# Altium footprint library pcb2D3D库101.PcbLib: 411 footprints (part 25 of 26)
Each footprint in its own frame and in the unit in brackets; x right, y up, seen from the top. Pads: shape width x height; smd on the part's side, far side on the other; paste and mask are expansions set on the pad; w line width, h text height; cw(c..) or ccw(c..) is an arc to the next point about the centre after c.
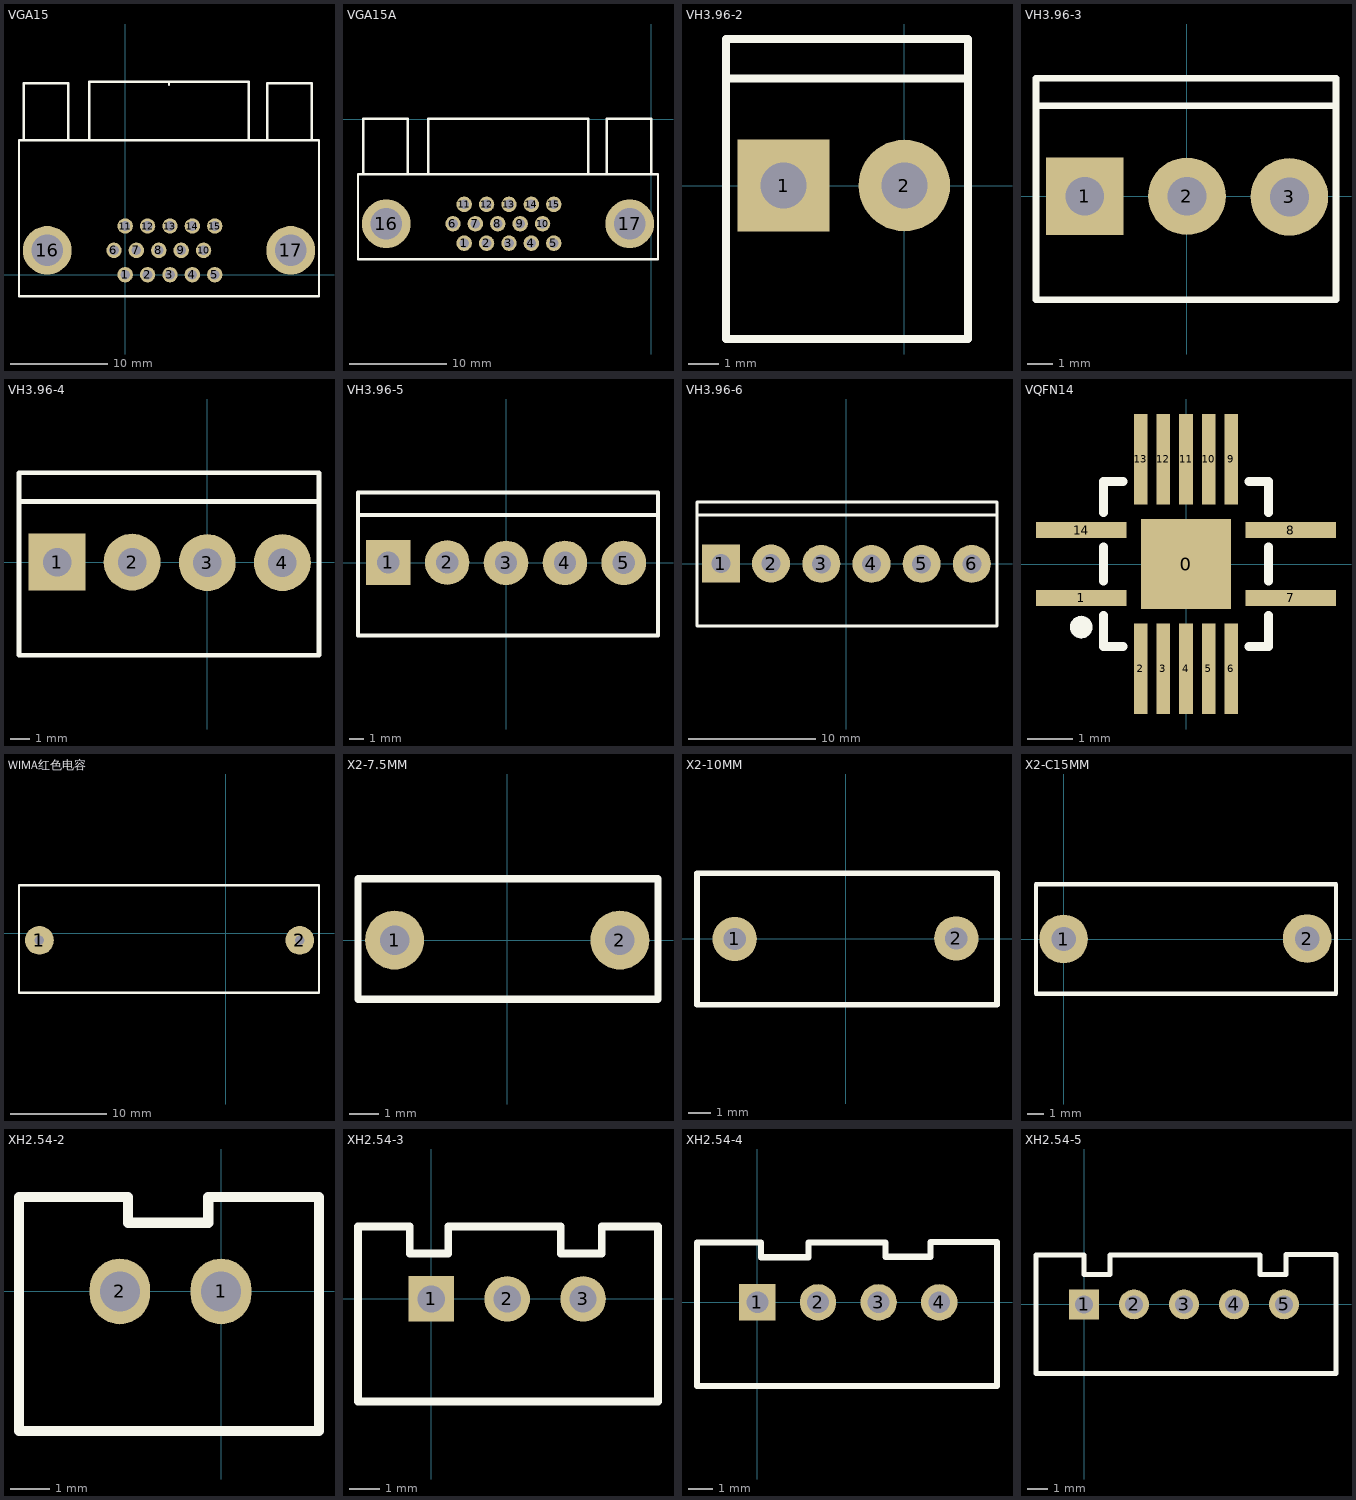
[diagram p24: the footprints below, top view; thin cyan lines are the x and y axes]

## VGA15 [mm]
pads (17):
  round 1.58 hole 1: 1(0,0) 2(2.3,0) 3(4.6,0) 4(6.9,0) 5(9.2,0) 6(-1.15,2.5) 7(1.15,2.5) 8(3.45,2.5) 9(5.75,2.5) 10(8.05,2.5) 11(0,5) 12(2.3,5) 13(4.6,5) 14(6.9,5) 15(9.2,5)
  round 5 hole 3.25: 16(-8,2.5) 17(17,2.5)
TopOverlay:
  lines w0.254: -10.9,-2.2 -10.9,13.8 19.9,13.8 19.9,-2.2 -10.89,-2.2 -10.9,-2.19 ; -10.4,13.8 -10.4,19.67 -5.83,19.67 -5.83,13.82 ; -3.7,13.8 -3.7,19.8 12.7,19.8 12.7,13.8 ; 4.5,19.5 4.5,19.8 ; 14.6,13.8 14.6,19.68 19.18,19.68 19.18,13.84
3D body "SW3dPS-Connector, D-Sub, 15 pin HD, RA, Receptacle.STEP": height 12.77, standoff -3.27, extent -11.055,-0.875 19.755,20.225

## VGA15A [mm]
pads (17):
  round 1.58 hole 1: 1(-19.205,-12.725) 2(-16.905,-12.725) 3(-14.605,-12.725) 4(-12.305,-12.725) 5(-10.005,-12.725) 6(-20.355,-10.733) 7(-18.055,-10.733) 8(-15.755,-10.733) 9(-13.455,-10.733) 10(-11.155,-10.733) 11(-19.205,-8.741) 12(-16.905,-8.741) 13(-14.605,-8.741) 14(-12.305,-8.741) 15(-10.005,-8.741)
  round 5 hole 3.25: 16(-27.205,-10.733) 17(-2.205,-10.733)
TopOverlay:
  lines w0.254: -29.58,-5.664 -29.58,0.025 -25.01,0.025 -25.01,-5.664 ; -22.88,-5.588 -22.88,0.025 -6.48,0.025 -6.48,-5.664 ; -4.58,-5.639 -4.58,0.025 0,0.025 0,-5.639 ; -30.105,-14.354 0.695,-14.354 0.695,-5.664 -30.105,-5.664 -30.105,-14.354
3D body "User Library-SLIM D-SUB RIGHT ANGLE PCB MOUNT.step": height 10.25, standoff -3.09, extent -30.008,-13.801 0.792,-0.331

## VH3.96-2 [mm]
height 3.5
pads (2):
  rect 3x3 hole 1.5 square: 1(-3.96,0)
  round 3 hole 1.5 square: 2(0,0)
TopOverlay:
  lines w0.254: -5.842,3.505 2.057,3.505 ; -5.842,-5.029 2.083,-5.029 2.083,4.801 -5.842,4.801 -5.842,-5.029
3D body "VH2.stp": height 14.83, standoff -3.46, extent -5.816,-5.08 1.956,4.928

## VH3.96-3 [mm]
height 3.5
pads (3):
  rect 3x3 hole 1.5 square: 1(-3.96,0)
  round 3 hole 1.5 square: 2(0,0) 3(3.962,-0.025)
TopOverlay:
  lines w0.254: -5.842,3.505 5.74,3.505 ; -5.842,-4.013 -5.842,4.572 5.766,4.572 5.766,-4.013 -5.842,-4.013
3D body "VH3.stp": height 14.83, standoff -3.46, extent -5.842,-5.15 5.893,4.858

## VH3.96-4 [mm]
height 3.5
pads (4):
  rect 3x3 hole 1.5 square: 1(-7.921,0.013)
  round 3 hole 1.5 square: 2(-3.961,0.013) 3(0.001,-0.013) 4(3.961,-0.013)
TopOverlay:
  lines w0.254: -9.86,3.213 5.893,3.213 ; -9.931,-4.902 -9.931,4.724 5.893,4.724 5.893,-4.902 -9.931,-4.902
3D body "VH4.stp": height 14.83, standoff -3.46, extent -9.83,-5.055 5.867,4.953

## VH3.96-5 [mm]
height 3.5
pads (5):
  rect 3x3 hole 1.5 square: 1(-7.921,0.013)
  round 3 hole 1.5 square: 2(-3.961,0.013) 3(0.001,-0.013) 4(3.961,-0.013) 5(7.921,-0.013)
TopOverlay:
  lines w0.254: -9.86,3.213 10.147,3.213 ; -9.957,-4.902 10.223,-4.902 10.223,4.724 -9.957,4.724 -9.957,-4.902
3D body "VH5.stp": height 14.83, standoff -3.46, extent -9.728,-5.048 9.932,4.959

## VH3.96-6 [mm]
height 3.5
pads (6):
  rect 3x3 hole 1.5 square: 1(-9.901,0.013)
  round 3 hole 1.5 square: 2(-5.941,0.013) 3(-1.979,-0.013) 4(1.981,-0.013) 5(5.941,-0.013) 6(9.901,-0.013)
TopOverlay:
  lines w0.254: -11.789,3.848 11.839,3.848 ; -11.789,-4.928 -11.789,4.877 11.89,4.877 11.89,-4.928 -11.789,-4.928
3D body "VH6.stp": height 14.43, standoff -3.86, extent -11.709,-5.08 11.913,4.928

## VQFN14 [mm]
pads (15):
  rect 2x2 smd: 0(0,0)
  rect 2x0.35 smd: 1(-2.319,-0.75) 7(2.319,-0.75) 8(2.319,0.75) 14(-2.319,0.75)
  rect 0.3x2 smd: 2(-1,-2.316) 3(-0.5,-2.316) 4(0,-2.316) 5(0.5,-2.316) 6(1,-2.316) 9(1,2.316) 10(0.5,2.316) 11(0,2.316) 12(-0.5,2.316) 13(-1,2.316)
TopOverlay:
  circle w0.1: c-2.319,-1.397 r0.2
  region: -2.54,-1.364 -2.319,-1.143 -2.119,-1.343 -2.119,-1.451 -2.319,-1.651 -2.54,-1.43 -2.54,-1.397
  lines w0.2: -1.825,-1.143 -1.825,-1.825 -1.397,-1.825 ; -1.825,-0.381 -1.825,0.381 ; -1.825,1.143 -1.825,1.825 -1.397,1.825 ; 1.397,-1.825 1.825,-1.825 1.825,-1.143 ; 1.397,1.825 1.825,1.825 1.825,1.143 ; 1.825,-0.381 1.825,0.381
3D body: height 0.2, standoff 0, extent 1.825,0.6 1.835,0.9
3D body: height 0.2, standoff 0, extent 1.825,-0.9 1.835,-0.6
3D body: height 0.2, standoff 0, extent -1.835,-0.9 -1.825,-0.6
3D body: height 0.2, standoff 0, extent -1.835,0.6 -1.825,0.9
3D body: height 1.01, standoff 0.01, extent -1.722,-1.442 -1.324,-1.043
3D body: height 1, standoff 0, extent -1.825,-1.825 1.825,1.825
3D body: height 0.2, standoff 0, extent -1.15,1.825 -0.85,1.835
3D body: height 0.2, standoff 0, extent -0.15,1.825 0.15,1.835
3D body: height 0.2, standoff 0, extent 0.35,1.825 0.65,1.835
3D body: height 0.2, standoff 0, extent 0.85,1.825 1.15,1.835
3D body: height 0.2, standoff 0, extent -0.65,1.825 -0.35,1.835
3D body: height 0.2, standoff 0, extent -0.65,-1.835 -0.35,-1.825
3D body: height 0.2, standoff 0, extent -1.15,-1.835 -0.85,-1.825
3D body: height 0.2, standoff 0, extent -0.15,-1.835 0.15,-1.825
3D body: height 0.2, standoff 0, extent 0.35,-1.835 0.65,-1.825
3D body: height 0.2, standoff 0, extent 0.85,-1.835 1.15,-1.825
3D body: height 0, standoff 0, extent -1.175,-1.825 -0.825,-1.316
3D body: height 0, standoff 0, extent -0.675,-1.825 -0.325,-1.316
3D body: height 0, standoff 0, extent -0.175,-1.825 0.175,-1.316
3D body: height 0, standoff 0, extent 0.325,-1.825 0.675,-1.316
3D body: height 0, standoff 0, extent 0.825,-1.825 1.175,-1.316
3D body: height 0, standoff 0, extent -1.175,1.32 -0.825,1.829
3D body: height 0, standoff 0, extent 0.325,1.32 0.675,1.829
3D body: height 0, standoff 0, extent -0.175,1.32 0.175,1.829
3D body: height 0, standoff 0, extent -0.675,1.32 -0.325,1.829
3D body: height 0, standoff 0, extent -1.175,1.32 -0.825,1.829
3D body: height 0, standoff 0, extent 0.825,1.32 1.175,1.829
3D body: height 0, standoff 0, extent 1.32,0.575 1.829,0.925
3D body: height 0, standoff 0, extent 1.32,-0.925 1.829,-0.575
3D body: height 0, standoff 0, extent -1.829,-0.925 -1.32,-0.575
3D body: height 0, standoff 0, extent -1.829,0.575 -1.32,0.925
3D body: height 0, standoff 0, extent -1.025,-1.025 1.025,1.025

## WIMA红色电容 [mm]
pads (2):
  round 3 hole 1: 1(-19.456,-0.762) 2(7.722,-0.762)
TopOverlay:
  lines w0.254: -21.59,-6.223 9.728,-6.223 9.728,4.978 -21.59,4.978 -21.59,-6.223
3D body: height 21, standoff 1, extent -21.59,-6.223 9.728,4.978
3D body: height 3, standoff -2, extent 7.226,-1.261 8.222,-0.263
3D body: height 3, standoff -2, extent -19.952,-1.261 -18.956,-0.263

## X2-7.5MM [mm]
pads (2):
  round 2 hole 1: 1(-3.823,0) 2(3.823,0)
TopOverlay:
  lines w0.254: -5.067,-2.007 5.118,-2.007 5.118,2.083 -5.067,2.083 -5.067,-2.007
3D body "10MM_X2_cap.step": height 9.5, standoff -3, extent -4.966,-1.956 5.034,2.044

## X2-10MM [mm] "18.25MM*11.4MM*5.78MM0.1UF 脚距15MM"
pads (2):
  round 2 hole 1: 1(-5,-0.013) 2(5,0.013)
TopOverlay:
  lines w0.254: -6.702,-2.984 -6.702,2.959 6.836,2.959 6.836,-2.984 -6.702,-2.984
3D body "X2-10MM.step": height 12, standoff -2.81, extent -6.5,-2.489 6.5,2.512

## X2-C15MM [mm] "18.25MM*11.4MM*5.78MM0.1UF 脚距15MM"
pads (2):
  round 3 hole 1.5: 1(0,0) 2(15.011,0.025)
TopOverlay:
  lines w0.254: -1.702,-3.378 16.789,-3.378 16.789,3.378 -1.702,3.378 -1.702,-3.378
3D body "X2-15MM.step": height 14, standoff -2.81, extent -1.431,-3.496 16.569,3.505

## XH2.54-2 [mil]
pads (2):
  oval 60x65 hole 39.37: 1(0,0) 2(-100.1,0)
TopOverlay:
  lines w10: -200,-138 -200,93.3 -92.1,93.3 -92.1,68 -12.6,68 -12.6,93.3 66.2,93.3 97,93.3 97,-138 -200,-138
3D body "sip2_n.stp": height 275.59, standoff -118.11, extent -197.64,-142.11 97.64,94.11

## XH2.54-3 [mm]
pads (3):
  rect 1.5x1.5 hole 0.9: 1(0,0)
  round 1.5 hole 0.9: 2(2.5,0) 3(5,0)
TopOverlay:
  lines w0.254: -2.413,-3.378 7.468,-3.378 7.468,2.388 5.613,2.388 5.613,1.5 4.267,1.5 4.267,2.388 0.559,2.388 0.559,1.5 -0.711,1.5 -0.711,2.388 -2.413,2.388 -2.413,-3.378
3D body "3pin-2.5.step": height 7, standoff -3.4, extent -2.41,-3.408 7.49,2.342

## XH2.54-4 [mm]
pads (4):
  rect 1.5x1.5 hole 0.9: 1(0,0)
  round 1.5 hole 0.9: 2(2.5,0) 3(5,0) 4(7.5,0)
TopOverlay:
  lines w0.254: -2.489,-3.454 -2.489,2.464 0.152,2.464 0.152,1.854 2.108,1.854 2.108,2.464 5.283,2.464 5.283,1.88 7.137,1.88 7.137,2.489 9.881,2.489 9.881,-3.454 -2.489,-3.454
3D body "4pin-2.5.step": height 7, standoff -3.4, extent -2.466,-3.383 9.934,2.367

## XH2.54-5 [mm]
pads (5):
  rect 1.5x1.5 hole 0.9: 1(0,0)
  round 1.5 hole 0.9: 2(2.5,0) 3(5,0) 4(7.5,0) 5(10,0)
TopOverlay:
  lines w0.254: 1.3,2.438 1.3,1.5 0,1.5 0,2.464 -2.4,2.464 -2.4,-3.454 12.6,-3.454 12.6,2.489 10.1,2.489 10.1,1.5 8.8,1.5 8.8,2.464 1.3,2.464
3D body "User Library-jst-b5b-xh-a.STEP": height 7, standoff -3.4, extent -2.511,-3.388 12.519,2.362